# Altium schematic symbol library jlcpcb_2025_04_capacitors_extended_0603.schlib: 3668 symbols (part 17 of 20) (continued)
## GRM188R71H153JA01D (continued)
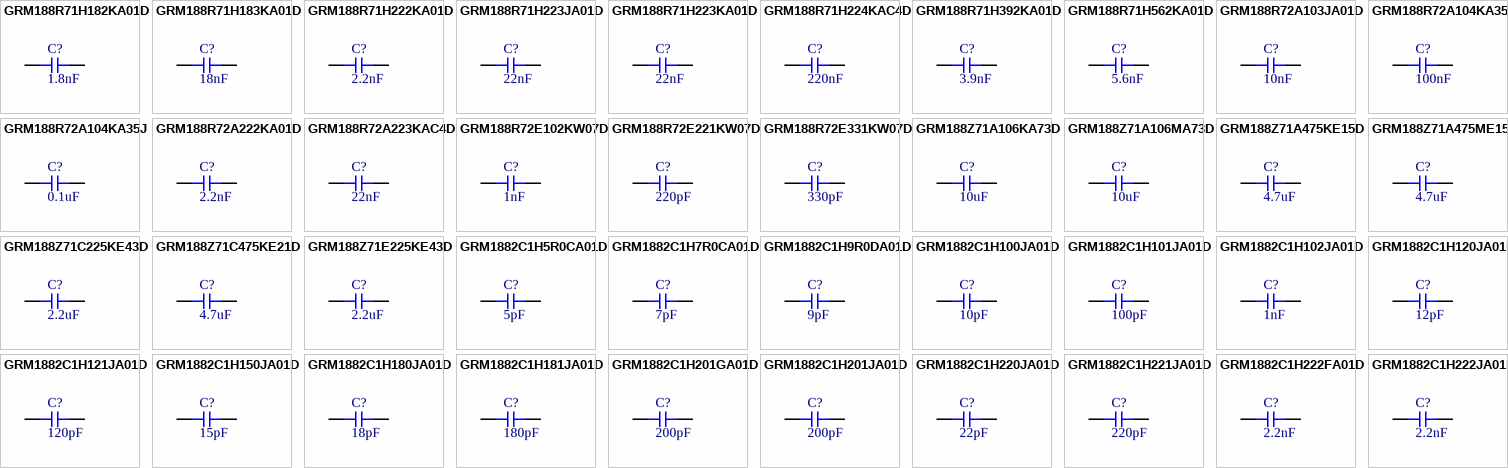
[diagram p75: symbols GRM188R71H182KA01D to GRM1882C1H222JA01D]

## GRM188R71H182KA01D
designator C?  Capacitance: 1.8nF  (hidden comment: *)
Capacitor, Ceramic (MLCC), 1.8nF, ±10%, 50V, X7R, ±10%, SMD 0603; Manufacturer: Murata Electronics; Manufacturer Part Number: GRM188R71H182KA01D; Package Size: 0603; JLCPCB Basic Part: No; JLCPCB Part Number: C440190; Supplier 1: LCSC; Category: Capacitors - MLCC; Supplier Part Number 1: C440190; Tolerance: ±10%; Voltage Rating: 50V; Temperature Coefficient: X7R; RoHS: Yes; ComponentLink1Description: Datasheet; ComponentLink1URL: https://wmsc.lcsc.com/wmsc/upload/file/pdf/v2/lcsc/2304140030_Murata-Electronics-GRM188R71H182KA01D_C440190.pdf; ComponentLink2Description: JLCPCB Part URL; ComponentLink2URL: https://jlcpcb.com/partdetail/C440190; ComponentLink3Description: LCSC Part URL; ComponentLink3URL: https://lcsc.com/product-detail/Multilayer-Ceramic-Capacitors-MLCC---SMD-SMT_Murata-Electronics-Murata-Electronics-GRM188R71H182KA01D_C440190.html
footprint CAP-0603 (0603 (1608M) Capacitor)
pins: 1, 2

## GRM188R71H183KA01D
designator C?  Capacitance: 18nF  (hidden comment: *)
Capacitor, Ceramic (MLCC), 18nF, ±10%, 50V, X7R, ±10%, SMD 0603; Manufacturer: Murata Electronics; Manufacturer Part Number: GRM188R71H183KA01D; Package Size: 0603; JLCPCB Basic Part: No; JLCPCB Part Number: C576480; Supplier 1: LCSC; Category: Capacitors - MLCC; Supplier Part Number 1: C576480; Tolerance: ±10%; Voltage Rating: 50V; Temperature Coefficient: X7R; RoHS: Yes; ComponentLink1Description: Datasheet; ComponentLink1URL: https://wmsc.lcsc.com/wmsc/upload/file/pdf/v2/lcsc/2203300930_Murata-Electronics-GRM188R71H183KA01D_C576480.pdf; ComponentLink2Description: JLCPCB Part URL; ComponentLink2URL: https://jlcpcb.com/partdetail/C576480; ComponentLink3Description: LCSC Part URL; ComponentLink3URL: https://lcsc.com/product-detail/Multilayer-Ceramic-Capacitors-MLCC---SMD-SMT_Murata-Electronics-Murata-Electronics-GRM188R71H183KA01D_C576480.html
footprint CAP-0603 (0603 (1608M) Capacitor)
pins: 1, 2

## GRM188R71H222KA01D
designator C?  Capacitance: 2.2nF  (hidden comment: *)
Capacitor, Ceramic (MLCC), 2.2nF, ±10%, 50V, X7R, ±10%, SMD 0603; Manufacturer: Murata Electronics; Manufacturer Part Number: GRM188R71H222KA01D; Package Size: 0603; JLCPCB Basic Part: No; JLCPCB Part Number: C86023; Supplier 1: LCSC; Category: Capacitors - MLCC; Supplier Part Number 1: C86023; Tolerance: ±10%; Voltage Rating: 50V; Temperature Coefficient: X7R; RoHS: Yes; ComponentLink1Description: Datasheet; ComponentLink1URL: https://wmsc.lcsc.com/wmsc/upload/file/pdf/v2/lcsc/2304140030_Murata-Electronics-GRM188R71H222KA01D_C86023.pdf; ComponentLink2Description: JLCPCB Part URL; ComponentLink2URL: https://jlcpcb.com/partdetail/C86023; ComponentLink3Description: LCSC Part URL; ComponentLink3URL: https://lcsc.com/product-detail/Multilayer-Ceramic-Capacitors-MLCC---SMD-SMT_Murata-Electronics-Murata-Electronics-GRM188R71H222KA01D_C86023.html
footprint CAP-0603 (0603 (1608M) Capacitor)
pins: 1, 2

## GRM188R71H223JA01D
designator C?  Capacitance: 22nF  (hidden comment: *)
Capacitor, Ceramic (MLCC), 22nF, ±5%, ±5%, SMD 0603; Manufacturer: Murata Electronics; Manufacturer Part Number: GRM188R71H223JA01D; Package Size: 0603; JLCPCB Basic Part: No; JLCPCB Part Number: C913671; Supplier 1: LCSC; Category: Capacitors - MLCC; Supplier Part Number 1: C913671; Tolerance: ±5%; RoHS: Yes; ComponentLink1Description: Datasheet; ComponentLink1URL: https://wmsc.lcsc.com/wmsc/upload/file/pdf/v2/lcsc/2201131300_Murata-Electronics-GRM188R71H223JA01D_C913671.pdf; ComponentLink2Description: JLCPCB Part URL; ComponentLink2URL: https://jlcpcb.com/partdetail/C913671; ComponentLink3Description: LCSC Part URL; ComponentLink3URL: https://lcsc.com/product-detail/Multilayer-Ceramic-Capacitors-MLCC---SMD-SMT_Murata-Electronics-Murata-Electronics-GRM188R71H223JA01D_C913671.html
footprint CAP-0603 (0603 (1608M) Capacitor)
pins: 1, 2

## GRM188R71H223KA01D
designator C?  Capacitance: 22nF  (hidden comment: *)
Capacitor, Ceramic (MLCC), 22nF, ±10%, 50V, X7R, ±10%, SMD 0603; Manufacturer: Murata Electronics; Manufacturer Part Number: GRM188R71H223KA01D; Package Size: 0603; JLCPCB Basic Part: No; JLCPCB Part Number: C77056; Supplier 1: LCSC; Category: Capacitors - MLCC; Supplier Part Number 1: C77056; Tolerance: ±10%; Voltage Rating: 50V; Temperature Coefficient: X7R; RoHS: Yes; ComponentLink1Description: Datasheet; ComponentLink1URL: https://wmsc.lcsc.com/wmsc/upload/file/pdf/v2/lcsc/2304140030_Murata-Electronics-GRM188R71H223KA01D_C77056.pdf; ComponentLink2Description: JLCPCB Part URL; ComponentLink2URL: https://jlcpcb.com/partdetail/C77056; ComponentLink3Description: LCSC Part URL; ComponentLink3URL: https://lcsc.com/product-detail/Multilayer-Ceramic-Capacitors-MLCC---SMD-SMT_Murata-Electronics-Murata-Electronics-GRM188R71H223KA01D_C77056.html
footprint CAP-0603 (0603 (1608M) Capacitor)
pins: 1, 2

## GRM188R71H224KAC4D
designator C?  Capacitance: 220nF  (hidden comment: *)
Capacitor, Ceramic (MLCC), 220nF, ±10%, 50V, X7R, ±10%, SMD 0603; Manufacturer: Murata Electronics; Manufacturer Part Number: GRM188R71H224KAC4D; Package Size: 0603; JLCPCB Basic Part: No; JLCPCB Part Number: C669503; Supplier 1: LCSC; Category: Capacitors - MLCC; Supplier Part Number 1: C669503; Tolerance: ±10%; Voltage Rating: 50V; Temperature Coefficient: X7R; RoHS: Yes; ComponentLink1Description: Datasheet; ComponentLink1URL: https://wmsc.lcsc.com/wmsc/upload/file/pdf/v2/lcsc/2006242037_Murata-Electronics-GRM188R71H224KAC4D_C669503.pdf; ComponentLink2Description: JLCPCB Part URL; ComponentLink2URL: https://jlcpcb.com/partdetail/C669503; ComponentLink3Description: LCSC Part URL; ComponentLink3URL: https://lcsc.com/product-detail/Multilayer-Ceramic-Capacitors-MLCC---SMD-SMT_Murata-Electronics-Murata-Electronics-GRM188R71H224KAC4D_C669503.html
footprint CAP-0603 (0603 (1608M) Capacitor)
pins: 1, 2

## GRM188R71H392KA01D
designator C?  Capacitance: 3.9nF  (hidden comment: *)
Capacitor, Ceramic (MLCC), 3.9nF, ±10%, 50V, X7R, ±10%, SMD 0603; Manufacturer: Murata Electronics; Manufacturer Part Number: GRM188R71H392KA01D; Package Size: 0603; JLCPCB Basic Part: No; JLCPCB Part Number: C470850; Supplier 1: LCSC; Category: Capacitors - MLCC; Supplier Part Number 1: C470850; Tolerance: ±10%; Voltage Rating: 50V; Temperature Coefficient: X7R; RoHS: Yes; ComponentLink1Description: Datasheet; ComponentLink1URL: https://wmsc.lcsc.com/wmsc/upload/file/pdf/v2/lcsc/2304140030_Murata-Electronics-GRM188R71H392KA01D_C470850.pdf; ComponentLink2Description: JLCPCB Part URL; ComponentLink2URL: https://jlcpcb.com/partdetail/C470850; ComponentLink3Description: LCSC Part URL; ComponentLink3URL: https://lcsc.com/product-detail/Multilayer-Ceramic-Capacitors-MLCC---SMD-SMT_Murata-Electronics-Murata-Electronics-GRM188R71H392KA01D_C470850.html
footprint CAP-0603 (0603 (1608M) Capacitor)
pins: 1, 2

## GRM188R71H562KA01D
designator C?  Capacitance: 5.6nF  (hidden comment: *)
Capacitor, Ceramic (MLCC), 5.6nF, ±10%, ±10%, SMD 0603; Manufacturer: Murata Electronics; Manufacturer Part Number: GRM188R71H562KA01D; Package Size: 0603; JLCPCB Basic Part: No; JLCPCB Part Number: C913740; Supplier 1: LCSC; Category: Capacitors - MLCC; Supplier Part Number 1: C913740; Tolerance: ±10%; RoHS: Yes; ComponentLink1Description: Datasheet; ComponentLink1URL: https://wmsc.lcsc.com/wmsc/upload/file/pdf/v2/lcsc/2201131300_Murata-Electronics-GRM188R71H562KA01D_C913740.pdf; ComponentLink2Description: JLCPCB Part URL; ComponentLink2URL: https://jlcpcb.com/partdetail/C913740; ComponentLink3Description: LCSC Part URL; ComponentLink3URL: https://lcsc.com/product-detail/Multilayer-Ceramic-Capacitors-MLCC---SMD-SMT_Murata-Electronics-Murata-Electronics-GRM188R71H562KA01D_C913740.html
footprint CAP-0603 (0603 (1608M) Capacitor)
pins: 1, 2

## GRM188R72A103JA01D
designator C?  Capacitance: 10nF  (hidden comment: *)
Capacitor, Ceramic (MLCC), 10nF, 100V, X7R, SMD 0603; Manufacturer: Murata Electronics; Manufacturer Part Number: GRM188R72A103JA01D; Package Size: 0603; JLCPCB Basic Part: No; JLCPCB Part Number: C2986295; Supplier 1: LCSC; Category: Capacitors - MLCC; Supplier Part Number 1: C2986295; Voltage Rating: 100V; Temperature Coefficient: X7R; RoHS: Yes; ComponentLink1Description: Datasheet; ComponentLink1URL: https://wmsc.lcsc.com/wmsc/upload/file/pdf/v2/lcsc/2204251600_Murata-Electronics-GRM188R72A103JA01D_C2986295.pdf; ComponentLink2Description: JLCPCB Part URL; ComponentLink2URL: https://jlcpcb.com/partdetail/C2986295; ComponentLink3Description: LCSC Part URL; ComponentLink3URL: https://lcsc.com/product-detail/Multilayer-Ceramic-Capacitors-MLCC---SMD-SMT_Murata-Electronics-Murata-Electronics-GRM188R72A103JA01D_C2986295.html
footprint CAP-0603 (0603 (1608M) Capacitor)
pins: 1, 2

## GRM188R72A104KA35D
designator C?  Capacitance: 100nF  (hidden comment: *)
Capacitor, Ceramic (MLCC), 100nF, ±10%, 100V, X7R, ±10%, SMD 0603; Manufacturer: Murata Electronics; Manufacturer Part Number: GRM188R72A104KA35D; Package Size: 0603; JLCPCB Basic Part: No; JLCPCB Part Number: C77058; Supplier 1: LCSC; Category: Capacitors - MLCC; Supplier Part Number 1: C77058; Tolerance: ±10%; Voltage Rating: 100V; Temperature Coefficient: X7R; RoHS: Yes; ComponentLink1Description: Datasheet; ComponentLink1URL: https://wmsc.lcsc.com/wmsc/upload/file/pdf/v2/lcsc/2304140030_Murata-Electronics-GRM188R72A104KA35D_C77058.pdf; ComponentLink2Description: JLCPCB Part URL; ComponentLink2URL: https://jlcpcb.com/partdetail/C77058; ComponentLink3Description: LCSC Part URL; ComponentLink3URL: https://lcsc.com/product-detail/Multilayer-Ceramic-Capacitors-MLCC---SMD-SMT_Murata-Electronics-Murata-Electronics-GRM188R72A104KA35D_C77058.html
footprint CAP-0603 (0603 (1608M) Capacitor)
pins: 1, 2

## GRM188R72A104KA35J
designator C?  Capacitance: 0.1uF  (hidden comment: *)
Capacitor, Ceramic (MLCC), 0.1uF, ±10%, 100V, X7R, ±10%, SMD 0603; Manufacturer: Murata Electronics; Manufacturer Part Number: GRM188R72A104KA35J; Package Size: 0603; JLCPCB Basic Part: No; JLCPCB Part Number: C3011705; Supplier 1: LCSC; Category: Capacitors - MLCC; Supplier Part Number 1: C3011705; Tolerance: ±10%; Voltage Rating: 100V; Temperature Coefficient: X7R; RoHS: Yes; ComponentLink1Description: Datasheet; ComponentLink1URL: https://wmsc.lcsc.com/wmsc/upload/file/pdf/v2/lcsc/2308111512_Murata-Electronics-GRM188R72A104KA35J_C3011705.pdf; ComponentLink2Description: JLCPCB Part URL; ComponentLink2URL: https://jlcpcb.com/partdetail/C3011705; ComponentLink3Description: LCSC Part URL; ComponentLink3URL: https://lcsc.com/product-detail/Multilayer-Ceramic-Capacitors-MLCC---SMD-SMT_Murata-Electronics-Murata-Electronics-GRM188R72A104KA35J_C3011705.html
footprint CAP-0603 (0603 (1608M) Capacitor)
pins: 1, 2

## GRM188R72A222KA01D
designator C?  Capacitance: 2.2nF  (hidden comment: *)
Capacitor, Ceramic (MLCC), 2.2nF, ±10%, 100V, X7R, ±10%, SMD 0603; Manufacturer: Murata Electronics; Manufacturer Part Number: GRM188R72A222KA01D; Package Size: 0603; JLCPCB Basic Part: No; JLCPCB Part Number: C469538; Supplier 1: LCSC; Category: Capacitors - MLCC; Supplier Part Number 1: C469538; Tolerance: ±10%; Voltage Rating: 100V; Temperature Coefficient: X7R; RoHS: Yes; ComponentLink1Description: Datasheet; ComponentLink1URL: https://wmsc.lcsc.com/wmsc/upload/file/pdf/v2/lcsc/2011082004_Murata-Electronics-GRM188R72A222KA01D_C469538.pdf; ComponentLink2Description: JLCPCB Part URL; ComponentLink2URL: https://jlcpcb.com/partdetail/C469538; ComponentLink3Description: LCSC Part URL; ComponentLink3URL: https://lcsc.com/product-detail/Multilayer-Ceramic-Capacitors-MLCC---SMD-SMT_Murata-Electronics-Murata-Electronics-GRM188R72A222KA01D_C469538.html
footprint CAP-0603 (0603 (1608M) Capacitor)
pins: 1, 2

## GRM188R72A223KAC4D
designator C?  Capacitance: 22nF  (hidden comment: *)
Capacitor, Ceramic (MLCC), 22nF, ±10%, 100V, X7R, ±10%, SMD 0603; Manufacturer: Murata Electronics; Manufacturer Part Number: GRM188R72A223KAC4D; Package Size: 0603; JLCPCB Basic Part: No; JLCPCB Part Number: C426087; Supplier 1: LCSC; Category: Capacitors - MLCC; Supplier Part Number 1: C426087; Tolerance: ±10%; Voltage Rating: 100V; Temperature Coefficient: X7R; RoHS: Yes; ComponentLink1Description: Datasheet; ComponentLink1URL: https://wmsc.lcsc.com/wmsc/upload/file/pdf/v2/lcsc/2304140030_Murata-Electronics-GRM188R72A223KAC4D_C426087.pdf; ComponentLink2Description: JLCPCB Part URL; ComponentLink2URL: https://jlcpcb.com/partdetail/C426087; ComponentLink3Description: LCSC Part URL; ComponentLink3URL: https://lcsc.com/product-detail/Multilayer-Ceramic-Capacitors-MLCC---SMD-SMT_Murata-Electronics-Murata-Electronics-GRM188R72A223KAC4D_C426087.html
footprint CAP-0603 (0603 (1608M) Capacitor)
pins: 1, 2

## GRM188R72E102KW07D
designator C?  Capacitance: 1nF  (hidden comment: *)
Capacitor, Ceramic (MLCC), 1nF, ±10%, 250V, X7R, ±10%, SMD 0603; Manufacturer: Murata Electronics; Manufacturer Part Number: GRM188R72E102KW07D; Package Size: 0603; JLCPCB Basic Part: No; JLCPCB Part Number: C913739; Supplier 1: LCSC; Category: Capacitors - MLCC; Supplier Part Number 1: C913739; Tolerance: ±10%; Voltage Rating: 250V; Temperature Coefficient: X7R; RoHS: Yes; ComponentLink1Description: Datasheet; ComponentLink1URL: https://wmsc.lcsc.com/wmsc/upload/file/pdf/v2/lcsc/2011151633_Murata-Electronics-GRM188R72E102KW07D_C913739.pdf; ComponentLink2Description: JLCPCB Part URL; ComponentLink2URL: https://jlcpcb.com/partdetail/C913739; ComponentLink3Description: LCSC Part URL; ComponentLink3URL: https://lcsc.com/product-detail/Multilayer-Ceramic-Capacitors-MLCC---SMD-SMT_Murata-Electronics-Murata-Electronics-GRM188R72E102KW07D_C913739.html
footprint CAP-0603 (0603 (1608M) Capacitor)
pins: 1, 2

## GRM188R72E221KW07D
designator C?  Capacitance: 220pF  (hidden comment: *)
Capacitor, Ceramic (MLCC), 220pF, ±10%, 250V, X7R, ±10%, SMD 0603; Manufacturer: Murata Electronics; Manufacturer Part Number: GRM188R72E221KW07D; Package Size: 0603; JLCPCB Basic Part: No; JLCPCB Part Number: C710930; Supplier 1: LCSC; Category: Capacitors - MLCC; Supplier Part Number 1: C710930; Tolerance: ±10%; Voltage Rating: 250V; Temperature Coefficient: X7R; RoHS: Yes; ComponentLink1Description: Datasheet; ComponentLink1URL: https://wmsc.lcsc.com/wmsc/upload/file/pdf/v2/lcsc/2308111640_Murata-Electronics-GRM188R72E221KW07D_C710930.pdf; ComponentLink2Description: JLCPCB Part URL; ComponentLink2URL: https://jlcpcb.com/partdetail/C710930; ComponentLink3Description: LCSC Part URL; ComponentLink3URL: https://lcsc.com/product-detail/Multilayer-Ceramic-Capacitors-MLCC---SMD-SMT_Murata-Electronics-Murata-Electronics-GRM188R72E221KW07D_C710930.html
footprint CAP-0603 (0603 (1608M) Capacitor)
pins: 1, 2

## GRM188R72E331KW07D
designator C?  Capacitance: 330pF  (hidden comment: *)
Capacitor, Ceramic (MLCC), 330pF, ±10%, 250V, X7R, ±10%, SMD 0603; Manufacturer: Murata Electronics; Manufacturer Part Number: GRM188R72E331KW07D; Package Size: 0603; JLCPCB Basic Part: No; JLCPCB Part Number: C162279; Supplier 1: LCSC; Category: Capacitors - MLCC; Supplier Part Number 1: C162279; Tolerance: ±10%; Voltage Rating: 250V; Temperature Coefficient: X7R; RoHS: Yes; ComponentLink1Description: Datasheet; ComponentLink1URL: https://wmsc.lcsc.com/wmsc/upload/file/pdf/v2/lcsc/1810311141_Murata-Electronics-GRM188R72E331KW07D_C162279.pdf; ComponentLink2Description: JLCPCB Part URL; ComponentLink2URL: https://jlcpcb.com/partdetail/C162279; ComponentLink3Description: LCSC Part URL; ComponentLink3URL: https://lcsc.com/product-detail/Multilayer-Ceramic-Capacitors-MLCC---SMD-SMT_Murata-Electronics-Murata-Electronics-GRM188R72E331KW07D_C162279.html
footprint CAP-0603 (0603 (1608M) Capacitor)
pins: 1, 2

## GRM188Z71A106KA73D
designator C?  Capacitance: 10uF  (hidden comment: *)
Capacitor, Ceramic (MLCC), 10uF, ±10%, 10V, X7R, ±10%, SMD 0603; Manufacturer: Murata Electronics; Manufacturer Part Number: GRM188Z71A106KA73D; Package Size: 0603; JLCPCB Basic Part: No; JLCPCB Part Number: C2959727; Supplier 1: LCSC; Category: Capacitors - MLCC; Supplier Part Number 1: C2959727; Tolerance: ±10%; Voltage Rating: 10V; Temperature Coefficient: X7R; RoHS: Yes; ComponentLink1Description: Datasheet; ComponentLink1URL: https://wmsc.lcsc.com/wmsc/upload/file/pdf/v2/lcsc/2203281430_Murata-Electronics-GRM188Z71A106KA73D_C2959727.pdf; ComponentLink2Description: JLCPCB Part URL; ComponentLink2URL: https://jlcpcb.com/partdetail/C2959727; ComponentLink3Description: LCSC Part URL; ComponentLink3URL: https://lcsc.com/product-detail/Multilayer-Ceramic-Capacitors-MLCC---SMD-SMT_Murata-Electronics-Murata-Electronics-GRM188Z71A106KA73D_C2959727.html
footprint CAP-0603 (0603 (1608M) Capacitor)
pins: 1, 2

## GRM188Z71A106MA73D
designator C?  Capacitance: 10uF  (hidden comment: *)
Capacitor, Ceramic (MLCC), 10uF, ±20%, 10V, X7R, ±20%, SMD 0603; Manufacturer: Murata Electronics; Manufacturer Part Number: GRM188Z71A106MA73D; Package Size: 0603; JLCPCB Basic Part: No; JLCPCB Part Number: C237435; Supplier 1: LCSC; Category: Capacitors - MLCC; Supplier Part Number 1: C237435; Tolerance: ±20%; Voltage Rating: 10V; Temperature Coefficient: X7R; RoHS: Yes; ComponentLink1Description: Datasheet; ComponentLink1URL: https://wmsc.lcsc.com/wmsc/upload/file/pdf/v2/lcsc/1912111437_Murata-Electronics-GRM188Z71A106MA73D_C237435.pdf; ComponentLink2Description: JLCPCB Part URL; ComponentLink2URL: https://jlcpcb.com/partdetail/C237435; ComponentLink3Description: LCSC Part URL; ComponentLink3URL: https://lcsc.com/product-detail/Multilayer-Ceramic-Capacitors-MLCC---SMD-SMT_Murata-Electronics-Murata-Electronics-GRM188Z71A106MA73D_C237435.html
footprint CAP-0603 (0603 (1608M) Capacitor)
pins: 1, 2

## GRM188Z71A475KE15D
designator C?  Capacitance: 4.7uF  (hidden comment: *)
Capacitor, Ceramic (MLCC), 4.7uF, ±10%, 10V, X7R, ±10%, SMD 0603; Manufacturer: Murata Electronics; Manufacturer Part Number: GRM188Z71A475KE15D; Package Size: 0603; JLCPCB Basic Part: No; JLCPCB Part Number: C913474; Supplier 1: LCSC; Category: Capacitors - MLCC; Supplier Part Number 1: C913474; Tolerance: ±10%; Voltage Rating: 10V; Temperature Coefficient: X7R; RoHS: Yes; ComponentLink1Description: Datasheet; ComponentLink1URL: https://wmsc.lcsc.com/wmsc/upload/file/pdf/v2/lcsc/2201131300_Murata-Electronics-GRM188Z71A475KE15D_C913474.pdf; ComponentLink2Description: JLCPCB Part URL; ComponentLink2URL: https://jlcpcb.com/partdetail/C913474; ComponentLink3Description: LCSC Part URL; ComponentLink3URL: https://lcsc.com/product-detail/Multilayer-Ceramic-Capacitors-MLCC---SMD-SMT_Murata-Electronics-Murata-Electronics-GRM188Z71A475KE15D_C913474.html
footprint CAP-0603 (0603 (1608M) Capacitor)
pins: 1, 2

## GRM188Z71A475ME15D
designator C?  Capacitance: 4.7uF  (hidden comment: *)
Capacitor, Ceramic (MLCC), 4.7uF, ±20%, 10V, X7R, ±20%, SMD 0603; Manufacturer: Murata Electronics; Manufacturer Part Number: GRM188Z71A475ME15D; Package Size: 0603; JLCPCB Basic Part: No; JLCPCB Part Number: C3835885; Supplier 1: LCSC; Category: Capacitors - MLCC; Supplier Part Number 1: C3835885; Tolerance: ±20%; Voltage Rating: 10V; Temperature Coefficient: X7R; RoHS: Yes; ComponentLink1Description: Datasheet; ComponentLink1URL: https://wmsc.lcsc.com/wmsc/upload/file/pdf/v2/lcsc/2308111513_Murata-Electronics-GRM188Z71A475ME15D_C3835885.pdf; ComponentLink2Description: JLCPCB Part URL; ComponentLink2URL: https://jlcpcb.com/partdetail/C3835885; ComponentLink3Description: LCSC Part URL; ComponentLink3URL: https://lcsc.com/product-detail/Multilayer-Ceramic-Capacitors-MLCC---SMD-SMT_Murata-Electronics-Murata-Electronics-GRM188Z71A475ME15D_C3835885.html
footprint CAP-0603 (0603 (1608M) Capacitor)
pins: 1, 2

## GRM188Z71C225KE43D
designator C?  Capacitance: 2.2uF  (hidden comment: *)
Capacitor, Ceramic (MLCC), 2.2uF, ±10%, 16V, X7R, ±10%, SMD 0603; Manufacturer: Murata Electronics; Manufacturer Part Number: GRM188Z71C225KE43D; Package Size: 0603; JLCPCB Basic Part: No; JLCPCB Part Number: C576485; Supplier 1: LCSC; Category: Capacitors - MLCC; Supplier Part Number 1: C576485; Tolerance: ±10%; Voltage Rating: 16V; Temperature Coefficient: X7R; RoHS: Yes; ComponentLink1Description: Datasheet; ComponentLink1URL: https://wmsc.lcsc.com/wmsc/upload/file/pdf/v2/lcsc/2109180930_Murata-Electronics-GRM188Z71C225KE43D_C576485.pdf; ComponentLink2Description: JLCPCB Part URL; ComponentLink2URL: https://jlcpcb.com/partdetail/C576485; ComponentLink3Description: LCSC Part URL; ComponentLink3URL: https://lcsc.com/product-detail/Multilayer-Ceramic-Capacitors-MLCC---SMD-SMT_Murata-Electronics-Murata-Electronics-GRM188Z71C225KE43D_C576485.html
footprint CAP-0603 (0603 (1608M) Capacitor)
pins: 1, 2

## GRM188Z71C475KE21D
designator C?  Capacitance: 4.7uF  (hidden comment: *)
Capacitor, Ceramic (MLCC), 4.7uF, ±10%, 16V, X7R, ±10%, SMD 0603; Manufacturer: Murata Electronics; Manufacturer Part Number: GRM188Z71C475KE21D; Package Size: 0603; JLCPCB Basic Part: No; JLCPCB Part Number: C389010; Supplier 1: LCSC; Category: Capacitors - MLCC; Supplier Part Number 1: C389010; Tolerance: ±10%; Voltage Rating: 16V; Temperature Coefficient: X7R; RoHS: Yes; ComponentLink1Description: Datasheet; ComponentLink1URL: https://wmsc.lcsc.com/wmsc/upload/file/pdf/v2/lcsc/1912111437_Murata-Electronics-GRM188Z71C475KE21D_C389010.pdf; ComponentLink2Description: JLCPCB Part URL; ComponentLink2URL: https://jlcpcb.com/partdetail/C389010; ComponentLink3Description: LCSC Part URL; ComponentLink3URL: https://lcsc.com/product-detail/Multilayer-Ceramic-Capacitors-MLCC---SMD-SMT_Murata-Electronics-Murata-Electronics-GRM188Z71C475KE21D_C389010.html
footprint CAP-0603 (0603 (1608M) Capacitor)
pins: 1, 2

## GRM188Z71E225KE43D
designator C?  Capacitance: 2.2uF  (hidden comment: *)
Capacitor, Ceramic (MLCC), 2.2uF, ±10%, 25V, X7R, ±10%, SMD 0603; Manufacturer: Murata Electronics; Manufacturer Part Number: GRM188Z71E225KE43D; Package Size: 0603; JLCPCB Basic Part: No; JLCPCB Part Number: C415535; Supplier 1: LCSC; Category: Capacitors - MLCC; Supplier Part Number 1: C415535; Tolerance: ±10%; Voltage Rating: 25V; Temperature Coefficient: X7R; RoHS: Yes; ComponentLink1Description: Datasheet; ComponentLink1URL: https://wmsc.lcsc.com/wmsc/upload/file/pdf/v2/lcsc/2304140030_Murata-Electronics-GRM188Z71E225KE43D_C415535.pdf; ComponentLink2Description: JLCPCB Part URL; ComponentLink2URL: https://jlcpcb.com/partdetail/C415535; ComponentLink3Description: LCSC Part URL; ComponentLink3URL: https://lcsc.com/product-detail/Multilayer-Ceramic-Capacitors-MLCC---SMD-SMT_Murata-Electronics-Murata-Electronics-GRM188Z71E225KE43D_C415535.html
footprint CAP-0603 (0603 (1608M) Capacitor)
pins: 1, 2

## GRM1882C1H5R0CA01D
designator C?  Capacitance: 5pF  (hidden comment: *)
Capacitor, Ceramic (MLCC), 5pF, 50V, CH, SMD 0603; Manufacturer: Murata Electronics; Manufacturer Part Number: GRM1882C1H5R0CA01D; Package Size: 0603; JLCPCB Basic Part: No; JLCPCB Part Number: C521239; Supplier 1: LCSC; Category: Capacitors - MLCC; Supplier Part Number 1: C521239; Voltage Rating: 50V; Temperature Coefficient: CH; RoHS: Yes; ComponentLink1Description: Datasheet; ComponentLink1URL: https://wmsc.lcsc.com/wmsc/upload/file/pdf/v2/lcsc/2005071504_Murata-Electronics-GRM1882C1H5R0CA01D_C521239.pdf; ComponentLink2Description: JLCPCB Part URL; ComponentLink2URL: https://jlcpcb.com/partdetail/C521239; ComponentLink3Description: LCSC Part URL; ComponentLink3URL: https://lcsc.com/product-detail/Multilayer-Ceramic-Capacitors-MLCC---SMD-SMT_Murata-Electronics-Murata-Electronics-GRM1882C1H5R0CA01D_C521239.html
footprint CAP-0603 (0603 (1608M) Capacitor)
pins: 1, 2

## GRM1882C1H7R0CA01D
designator C?  Capacitance: 7pF  (hidden comment: *)
Capacitor, Ceramic (MLCC), 7pF, SMD 0603; Manufacturer: Murata Electronics; Manufacturer Part Number: GRM1882C1H7R0CA01D; Package Size: 0603; JLCPCB Basic Part: No; JLCPCB Part Number: C913519; Supplier 1: LCSC; Category: Capacitors - MLCC; Supplier Part Number 1: C913519; RoHS: Yes; ComponentLink1Description: Datasheet; ComponentLink1URL: https://wmsc.lcsc.com/wmsc/upload/file/pdf/v2/lcsc/2201131300_Murata-Electronics-GRM1882C1H7R0CA01D_C913519.pdf; ComponentLink2Description: JLCPCB Part URL; ComponentLink2URL: https://jlcpcb.com/partdetail/C913519; ComponentLink3Description: LCSC Part URL; ComponentLink3URL: https://lcsc.com/product-detail/Multilayer-Ceramic-Capacitors-MLCC---SMD-SMT_Murata-Electronics-Murata-Electronics-GRM1882C1H7R0CA01D_C913519.html
footprint CAP-0603 (0603 (1608M) Capacitor)
pins: 1, 2

## GRM1882C1H9R0DA01D
designator C?  Capacitance: 9pF  (hidden comment: *)
Capacitor, Ceramic (MLCC), 9pF, 50V, CH, SMD 0603; Manufacturer: Murata Electronics; Manufacturer Part Number: GRM1882C1H9R0DA01D; Package Size: 0603; JLCPCB Basic Part: No; JLCPCB Part Number: C492058; Supplier 1: LCSC; Category: Capacitors - MLCC; Supplier Part Number 1: C492058; Voltage Rating: 50V; Temperature Coefficient: CH; RoHS: Yes; ComponentLink1Description: Datasheet; ComponentLink1URL: https://wmsc.lcsc.com/wmsc/upload/file/pdf/v2/lcsc/2308111810_Murata-Electronics-GRM1882C1H9R0DA01D_C492058.pdf; ComponentLink2Description: JLCPCB Part URL; ComponentLink2URL: https://jlcpcb.com/partdetail/C492058; ComponentLink3Description: LCSC Part URL; ComponentLink3URL: https://lcsc.com/product-detail/Multilayer-Ceramic-Capacitors-MLCC---SMD-SMT_Murata-Electronics-Murata-Electronics-GRM1882C1H9R0DA01D_C492058.html
footprint CAP-0603 (0603 (1608M) Capacitor)
pins: 1, 2

## GRM1882C1H100JA01D
designator C?  Capacitance: 10pF  (hidden comment: *)
Capacitor, Ceramic (MLCC), 10pF, ±5%, 50V, CH, ±5%, SMD 0603; Manufacturer: Murata Electronics; Manufacturer Part Number: GRM1882C1H100JA01D; Package Size: 0603; JLCPCB Basic Part: No; JLCPCB Part Number: C85966; Supplier 1: LCSC; Category: Capacitors - MLCC; Supplier Part Number 1: C85966; Tolerance: ±5%; Voltage Rating: 50V; Temperature Coefficient: CH; RoHS: Yes; ComponentLink1Description: Datasheet; ComponentLink1URL: https://wmsc.lcsc.com/wmsc/upload/file/pdf/v2/lcsc/2304140030_Murata-Electronics-GRM1882C1H100JA01D_C85966.pdf; ComponentLink2Description: JLCPCB Part URL; ComponentLink2URL: https://jlcpcb.com/partdetail/C85966; ComponentLink3Description: LCSC Part URL; ComponentLink3URL: https://lcsc.com/product-detail/Multilayer-Ceramic-Capacitors-MLCC---SMD-SMT_Murata-Electronics-Murata-Electronics-GRM1882C1H100JA01D_C85966.html
footprint CAP-0603 (0603 (1608M) Capacitor)
pins: 1, 2

## GRM1882C1H101JA01D
designator C?  Capacitance: 100pF  (hidden comment: *)
Capacitor, Ceramic (MLCC), 100pF, ±5%, 50V, CH, ±5%, SMD 0603; Manufacturer: Murata Electronics; Manufacturer Part Number: GRM1882C1H101JA01D; Package Size: 0603; JLCPCB Basic Part: No; JLCPCB Part Number: C85967; Supplier 1: LCSC; Category: Capacitors - MLCC; Supplier Part Number 1: C85967; Tolerance: ±5%; Voltage Rating: 50V; Temperature Coefficient: CH; RoHS: Yes; ComponentLink1Description: Datasheet; ComponentLink1URL: https://wmsc.lcsc.com/wmsc/upload/file/pdf/v2/lcsc/2304140030_Murata-Electronics-GRM1882C1H101JA01D_C85967.pdf; ComponentLink2Description: JLCPCB Part URL; ComponentLink2URL: https://jlcpcb.com/partdetail/C85967; ComponentLink3Description: LCSC Part URL; ComponentLink3URL: https://lcsc.com/product-detail/Multilayer-Ceramic-Capacitors-MLCC---SMD-SMT_Murata-Electronics-Murata-Electronics-GRM1882C1H101JA01D_C85967.html
footprint CAP-0603 (0603 (1608M) Capacitor)
pins: 1, 2

## GRM1882C1H102JA01D
designator C?  Capacitance: 1nF  (hidden comment: *)
Capacitor, Ceramic (MLCC), 1nF, ±5%, 50V, CH, ±5%, SMD 0603; Manufacturer: Murata Electronics; Manufacturer Part Number: GRM1882C1H102JA01D; Package Size: 0603; JLCPCB Basic Part: No; JLCPCB Part Number: C85968; Supplier 1: LCSC; Category: Capacitors - MLCC; Supplier Part Number 1: C85968; Tolerance: ±5%; Voltage Rating: 50V; Temperature Coefficient: CH; RoHS: Yes; ComponentLink1Description: Datasheet; ComponentLink1URL: https://wmsc.lcsc.com/wmsc/upload/file/pdf/v2/lcsc/2304140030_Murata-Electronics-GRM1882C1H102JA01D_C85968.pdf; ComponentLink2Description: JLCPCB Part URL; ComponentLink2URL: https://jlcpcb.com/partdetail/C85968; ComponentLink3Description: LCSC Part URL; ComponentLink3URL: https://lcsc.com/product-detail/Multilayer-Ceramic-Capacitors-MLCC---SMD-SMT_Murata-Electronics-Murata-Electronics-GRM1882C1H102JA01D_C85968.html
footprint CAP-0603 (0603 (1608M) Capacitor)
pins: 1, 2

## GRM1882C1H120JA01D
designator C?  Capacitance: 12pF  (hidden comment: *)
Capacitor, Ceramic (MLCC), 12pF, ±5%, 50V, CH, ±5%, SMD 0603; Manufacturer: Murata Electronics; Manufacturer Part Number: GRM1882C1H120JA01D; Package Size: 0603; JLCPCB Basic Part: No; JLCPCB Part Number: C464425; Supplier 1: LCSC; Category: Capacitors - MLCC; Supplier Part Number 1: C464425; Tolerance: ±5%; Voltage Rating: 50V; Temperature Coefficient: CH; RoHS: Yes; ComponentLink1Description: Datasheet; ComponentLink1URL: https://wmsc.lcsc.com/wmsc/upload/file/pdf/v2/lcsc/2304140030_Murata-Electronics-GRM1882C1H120JA01D_C464425.pdf; ComponentLink2Description: JLCPCB Part URL; ComponentLink2URL: https://jlcpcb.com/partdetail/C464425; ComponentLink3Description: LCSC Part URL; ComponentLink3URL: https://lcsc.com/product-detail/Multilayer-Ceramic-Capacitors-MLCC---SMD-SMT_Murata-Electronics-Murata-Electronics-GRM1882C1H120JA01D_C464425.html
footprint CAP-0603 (0603 (1608M) Capacitor)
pins: 1, 2

## GRM1882C1H121JA01D
designator C?  Capacitance: 120pF  (hidden comment: *)
Capacitor, Ceramic (MLCC), 120pF, ±5%, ±5%, SMD 0603; Manufacturer: Murata Electronics; Manufacturer Part Number: GRM1882C1H121JA01D; Package Size: 0603; JLCPCB Basic Part: No; JLCPCB Part Number: C913675; Supplier 1: LCSC; Category: Capacitors - MLCC; Supplier Part Number 1: C913675; Tolerance: ±5%; RoHS: Yes; ComponentLink1Description: Datasheet; ComponentLink1URL: https://wmsc.lcsc.com/wmsc/upload/file/pdf/v2/lcsc/2201131300_Murata-Electronics-GRM1882C1H121JA01D_C913675.pdf; ComponentLink2Description: JLCPCB Part URL; ComponentLink2URL: https://jlcpcb.com/partdetail/C913675; ComponentLink3Description: LCSC Part URL; ComponentLink3URL: https://lcsc.com/product-detail/Multilayer-Ceramic-Capacitors-MLCC---SMD-SMT_Murata-Electronics-Murata-Electronics-GRM1882C1H121JA01D_C913675.html
footprint CAP-0603 (0603 (1608M) Capacitor)
pins: 1, 2

## GRM1882C1H150JA01D
designator C?  Capacitance: 15pF  (hidden comment: *)
Capacitor, Ceramic (MLCC), 15pF, ±5%, ±5%, SMD 0603; Manufacturer: Murata Electronics; Manufacturer Part Number: GRM1882C1H150JA01D; Package Size: 0603; JLCPCB Basic Part: No; JLCPCB Part Number: C913684; Supplier 1: LCSC; Category: Capacitors - MLCC; Supplier Part Number 1: C913684; Tolerance: ±5%; RoHS: Yes; ComponentLink1Description: Datasheet; ComponentLink1URL: https://wmsc.lcsc.com/wmsc/upload/file/pdf/v2/lcsc/2201131300_Murata-Electronics-GRM1882C1H150JA01D_C913684.pdf; ComponentLink2Description: JLCPCB Part URL; ComponentLink2URL: https://jlcpcb.com/partdetail/C913684; ComponentLink3Description: LCSC Part URL; ComponentLink3URL: https://lcsc.com/product-detail/Multilayer-Ceramic-Capacitors-MLCC---SMD-SMT_Murata-Electronics-Murata-Electronics-GRM1882C1H150JA01D_C913684.html
footprint CAP-0603 (0603 (1608M) Capacitor)
pins: 1, 2

## GRM1882C1H180JA01D
designator C?  Capacitance: 18pF  (hidden comment: *)
Capacitor, Ceramic (MLCC), 18pF, ±5%, 50V, CH, ±5%, SMD 0603; Manufacturer: Murata Electronics; Manufacturer Part Number: GRM1882C1H180JA01D; Package Size: 0603; JLCPCB Basic Part: No; JLCPCB Part Number: C415402; Supplier 1: LCSC; Category: Capacitors - MLCC; Supplier Part Number 1: C415402; Tolerance: ±5%; Voltage Rating: 50V; Temperature Coefficient: CH; RoHS: Yes; ComponentLink1Description: Datasheet; ComponentLink1URL: https://wmsc.lcsc.com/wmsc/upload/file/pdf/v2/lcsc/2304140030_Murata-Electronics-GRM1882C1H180JA01D_C415402.pdf; ComponentLink2Description: JLCPCB Part URL; ComponentLink2URL: https://jlcpcb.com/partdetail/C415402; ComponentLink3Description: LCSC Part URL; ComponentLink3URL: https://lcsc.com/product-detail/Multilayer-Ceramic-Capacitors-MLCC---SMD-SMT_Murata-Electronics-Murata-Electronics-GRM1882C1H180JA01D_C415402.html
footprint CAP-0603 (0603 (1608M) Capacitor)
pins: 1, 2

## GRM1882C1H181JA01D
designator C?  Capacitance: 180pF  (hidden comment: *)
Capacitor, Ceramic (MLCC), 180pF, ±5%, 50V, CH, ±5%, SMD 0603; Manufacturer: Murata Electronics; Manufacturer Part Number: GRM1882C1H181JA01D; Package Size: 0603; JLCPCB Basic Part: No; JLCPCB Part Number: C363959; Supplier 1: LCSC; Category: Capacitors - MLCC; Supplier Part Number 1: C363959; Tolerance: ±5%; Voltage Rating: 50V; Temperature Coefficient: CH; RoHS: Yes; ComponentLink1Description: Datasheet; ComponentLink1URL: https://wmsc.lcsc.com/wmsc/upload/file/pdf/v2/lcsc/1912111437_Murata-Electronics-GRM1882C1H181JA01D_C363959.pdf; ComponentLink2Description: JLCPCB Part URL; ComponentLink2URL: https://jlcpcb.com/partdetail/C363959; ComponentLink3Description: LCSC Part URL; ComponentLink3URL: https://lcsc.com/product-detail/Multilayer-Ceramic-Capacitors-MLCC---SMD-SMT_Murata-Electronics-Murata-Electronics-GRM1882C1H181JA01D_C363959.html
footprint CAP-0603 (0603 (1608M) Capacitor)
pins: 1, 2

## GRM1882C1H201GA01D
designator C?  Capacitance: 200pF  (hidden comment: *)
Capacitor, Ceramic (MLCC), 200pF, ±2%, ±2%, SMD 0603; Manufacturer: Murata Electronics; Manufacturer Part Number: GRM1882C1H201GA01D; Package Size: 0603; JLCPCB Basic Part: No; JLCPCB Part Number: C913564; Supplier 1: LCSC; Category: Capacitors - MLCC; Supplier Part Number 1: C913564; Tolerance: ±2%; RoHS: Yes; ComponentLink1Description: Datasheet; ComponentLink1URL: https://wmsc.lcsc.com/wmsc/upload/file/pdf/v2/lcsc/2201131300_Murata-Electronics-GRM1882C1H201GA01D_C913564.pdf; ComponentLink2Description: JLCPCB Part URL; ComponentLink2URL: https://jlcpcb.com/partdetail/C913564; ComponentLink3Description: LCSC Part URL; ComponentLink3URL: https://lcsc.com/product-detail/Multilayer-Ceramic-Capacitors-MLCC---SMD-SMT_Murata-Electronics-Murata-Electronics-GRM1882C1H201GA01D_C913564.html
footprint CAP-0603 (0603 (1608M) Capacitor)
pins: 1, 2

## GRM1882C1H201JA01D
designator C?  Capacitance: 200pF  (hidden comment: *)
Capacitor, Ceramic (MLCC), 200pF, ±5%, 50V, CH, ±5%, SMD 0603; Manufacturer: Murata Electronics; Manufacturer Part Number: GRM1882C1H201JA01D; Package Size: 0603; JLCPCB Basic Part: No; JLCPCB Part Number: C415385; Supplier 1: LCSC; Category: Capacitors - MLCC; Supplier Part Number 1: C415385; Tolerance: ±5%; Voltage Rating: 50V; Temperature Coefficient: CH; RoHS: Yes; ComponentLink1Description: Datasheet; ComponentLink1URL: https://wmsc.lcsc.com/wmsc/upload/file/pdf/v2/lcsc/2304140030_Murata-Electronics-GRM1882C1H201JA01D_C415385.pdf; ComponentLink2Description: JLCPCB Part URL; ComponentLink2URL: https://jlcpcb.com/partdetail/C415385; ComponentLink3Description: LCSC Part URL; ComponentLink3URL: https://lcsc.com/product-detail/Multilayer-Ceramic-Capacitors-MLCC---SMD-SMT_Murata-Electronics-Murata-Electronics-GRM1882C1H201JA01D_C415385.html
footprint CAP-0603 (0603 (1608M) Capacitor)
pins: 1, 2

## GRM1882C1H220JA01D
designator C?  Capacitance: 22pF  (hidden comment: *)
Capacitor, Ceramic (MLCC), 22pF, ±5%, 50V, CH, ±5%, SMD 0603; Manufacturer: Murata Electronics; Manufacturer Part Number: GRM1882C1H220JA01D; Package Size: 0603; JLCPCB Basic Part: No; JLCPCB Part Number: C85969; Supplier 1: LCSC; Category: Capacitors - MLCC; Supplier Part Number 1: C85969; Tolerance: ±5%; Voltage Rating: 50V; Temperature Coefficient: CH; RoHS: Yes; ComponentLink1Description: Datasheet; ComponentLink1URL: https://wmsc.lcsc.com/wmsc/upload/file/pdf/v2/lcsc/2304140030_Murata-Electronics-GRM1882C1H220JA01D_C85969.pdf; ComponentLink2Description: JLCPCB Part URL; ComponentLink2URL: https://jlcpcb.com/partdetail/C85969; ComponentLink3Description: LCSC Part URL; ComponentLink3URL: https://lcsc.com/product-detail/Multilayer-Ceramic-Capacitors-MLCC---SMD-SMT_Murata-Electronics-Murata-Electronics-GRM1882C1H220JA01D_C85969.html
footprint CAP-0603 (0603 (1608M) Capacitor)
pins: 1, 2

## GRM1882C1H221JA01D
designator C?  Capacitance: 220pF  (hidden comment: *)
Capacitor, Ceramic (MLCC), 220pF, ±5%, 50V, CH, ±5%, SMD 0603; Manufacturer: Murata Electronics; Manufacturer Part Number: GRM1882C1H221JA01D; Package Size: 0603; JLCPCB Basic Part: No; JLCPCB Part Number: C415413; Supplier 1: LCSC; Category: Capacitors - MLCC; Supplier Part Number 1: C415413; Tolerance: ±5%; Voltage Rating: 50V; Temperature Coefficient: CH; RoHS: Yes; ComponentLink1Description: Datasheet; ComponentLink1URL: https://wmsc.lcsc.com/wmsc/upload/file/pdf/v2/lcsc/2304140030_Murata-Electronics-GRM1882C1H221JA01D_C415413.pdf; ComponentLink2Description: JLCPCB Part URL; ComponentLink2URL: https://jlcpcb.com/partdetail/C415413; ComponentLink3Description: LCSC Part URL; ComponentLink3URL: https://lcsc.com/product-detail/Multilayer-Ceramic-Capacitors-MLCC---SMD-SMT_Murata-Electronics-Murata-Electronics-GRM1882C1H221JA01D_C415413.html
footprint CAP-0603 (0603 (1608M) Capacitor)
pins: 1, 2

## GRM1882C1H222FA01D
designator C?  Capacitance: 2.2nF  (hidden comment: *)
Capacitor, Ceramic (MLCC), 2.2nF, ±1%, ±1%, SMD 0603; Manufacturer: Murata Electronics; Manufacturer Part Number: GRM1882C1H222FA01D; Package Size: 0603; JLCPCB Basic Part: No; JLCPCB Part Number: C783273; Supplier 1: LCSC; Category: Capacitors - MLCC; Supplier Part Number 1: C783273; Tolerance: ±1%; RoHS: Yes; ComponentLink1Description: Datasheet; ComponentLink1URL: https://wmsc.lcsc.com/wmsc/upload/file/pdf/v2/lcsc/2304140030_Murata-Electronics-GRM1882C1H222FA01D_C783273.pdf; ComponentLink2Description: JLCPCB Part URL; ComponentLink2URL: https://jlcpcb.com/partdetail/C783273; ComponentLink3Description: LCSC Part URL; ComponentLink3URL: https://lcsc.com/product-detail/Multilayer-Ceramic-Capacitors-MLCC---SMD-SMT_Murata-Electronics-Murata-Electronics-GRM1882C1H222FA01D_C783273.html
footprint CAP-0603 (0603 (1608M) Capacitor)
pins: 1, 2

## GRM1882C1H222JA01D
designator C?  Capacitance: 2.2nF  (hidden comment: *)
Capacitor, Ceramic (MLCC), 2.2nF, ±5%, 50V, CH, ±5%, SMD 0603; Manufacturer: Murata Electronics; Manufacturer Part Number: GRM1882C1H222JA01D; Package Size: 0603; JLCPCB Basic Part: No; JLCPCB Part Number: C469170; Supplier 1: LCSC; Category: Capacitors - MLCC; Supplier Part Number 1: C469170; Tolerance: ±5%; Voltage Rating: 50V; Temperature Coefficient: CH; RoHS: Yes; ComponentLink1Description: Datasheet; ComponentLink1URL: https://wmsc.lcsc.com/wmsc/upload/file/pdf/v2/lcsc/2304140030_Murata-Electronics-GRM1882C1H222JA01D_C469170.pdf; ComponentLink2Description: JLCPCB Part URL; ComponentLink2URL: https://jlcpcb.com/partdetail/C469170; ComponentLink3Description: LCSC Part URL; ComponentLink3URL: https://lcsc.com/product-detail/Multilayer-Ceramic-Capacitors-MLCC---SMD-SMT_Murata-Electronics-Murata-Electronics-GRM1882C1H222JA01D_C469170.html
footprint CAP-0603 (0603 (1608M) Capacitor)
pins: 1, 2

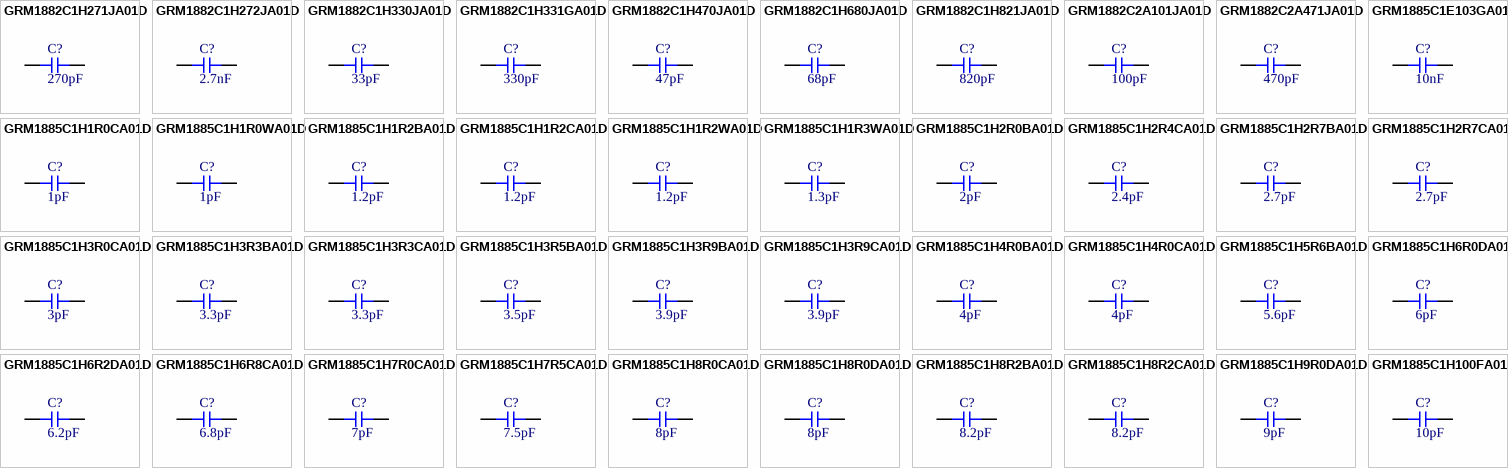
[diagram p76: symbols GRM1882C1H271JA01D to GRM1885C1H100FA01D]

## GRM1882C1H271JA01D
designator C?  Capacitance: 270pF  (hidden comment: *)
Capacitor, Ceramic (MLCC), 270pF, ±5%, 50V, CH, ±5%, SMD 0603; Manufacturer: Murata Electronics; Manufacturer Part Number: GRM1882C1H271JA01D; Package Size: 0603; JLCPCB Basic Part: No; JLCPCB Part Number: C363958; Supplier 1: LCSC; Category: Capacitors - MLCC; Supplier Part Number 1: C363958; Tolerance: ±5%; Voltage Rating: 50V; Temperature Coefficient: CH; RoHS: Yes; ComponentLink1Description: Datasheet; ComponentLink1URL: https://wmsc.lcsc.com/wmsc/upload/file/pdf/v2/lcsc/1912111437_Murata-Electronics-GRM1882C1H271JA01D_C363958.pdf; ComponentLink2Description: JLCPCB Part URL; ComponentLink2URL: https://jlcpcb.com/partdetail/C363958; ComponentLink3Description: LCSC Part URL; ComponentLink3URL: https://lcsc.com/product-detail/Multilayer-Ceramic-Capacitors-MLCC---SMD-SMT_Murata-Electronics-Murata-Electronics-GRM1882C1H271JA01D_C363958.html
footprint CAP-0603 (0603 (1608M) Capacitor)
pins: 1, 2

## GRM1882C1H272JA01D
designator C?  Capacitance: 2.7nF  (hidden comment: *)
Capacitor, Ceramic (MLCC), 2.7nF, ±5%, 50V, CH, ±5%, SMD 0603; Manufacturer: Murata Electronics; Manufacturer Part Number: GRM1882C1H272JA01D; Package Size: 0603; JLCPCB Basic Part: No; JLCPCB Part Number: C430712; Supplier 1: LCSC; Category: Capacitors - MLCC; Supplier Part Number 1: C430712; Tolerance: ±5%; Voltage Rating: 50V; Temperature Coefficient: CH; RoHS: Yes; ComponentLink1Description: Datasheet; ComponentLink1URL: https://wmsc.lcsc.com/wmsc/upload/file/pdf/v2/lcsc/2304140030_Murata-Electronics-GRM1882C1H272JA01D_C430712.pdf; ComponentLink2Description: JLCPCB Part URL; ComponentLink2URL: https://jlcpcb.com/partdetail/C430712; ComponentLink3Description: LCSC Part URL; ComponentLink3URL: https://lcsc.com/product-detail/Multilayer-Ceramic-Capacitors-MLCC---SMD-SMT_Murata-Electronics-Murata-Electronics-GRM1882C1H272JA01D_C430712.html
footprint CAP-0603 (0603 (1608M) Capacitor)
pins: 1, 2

## GRM1882C1H330JA01D
designator C?  Capacitance: 33pF  (hidden comment: *)
Capacitor, Ceramic (MLCC), 33pF, ±5%, 50V, CH, ±5%, SMD 0603; Manufacturer: Murata Electronics; Manufacturer Part Number: GRM1882C1H330JA01D; Package Size: 0603; JLCPCB Basic Part: No; JLCPCB Part Number: C85970; Supplier 1: LCSC; Category: Capacitors - MLCC; Supplier Part Number 1: C85970; Tolerance: ±5%; Voltage Rating: 50V; Temperature Coefficient: CH; RoHS: Yes; ComponentLink1Description: Datasheet; ComponentLink1URL: https://wmsc.lcsc.com/wmsc/upload/file/pdf/v2/lcsc/2304140030_Murata-Electronics-GRM1882C1H330JA01D_C85970.pdf; ComponentLink2Description: JLCPCB Part URL; ComponentLink2URL: https://jlcpcb.com/partdetail/C85970; ComponentLink3Description: LCSC Part URL; ComponentLink3URL: https://lcsc.com/product-detail/Multilayer-Ceramic-Capacitors-MLCC---SMD-SMT_Murata-Electronics-Murata-Electronics-GRM1882C1H330JA01D_C85970.html
footprint CAP-0603 (0603 (1608M) Capacitor)
pins: 1, 2
